# Altium footprint library ADP_Misc.PcbLib: 41 footprints (part 3 of 3)
Each footprint in its own frame and in the unit in brackets; x right, y up, seen from the top. Pads: shape width x height; smd on the part's side, far side on the other; paste and mask are expansions set on the pad; w line width, h text height; cw(c..) or ccw(c..) is an arc to the next point about the centre after c.
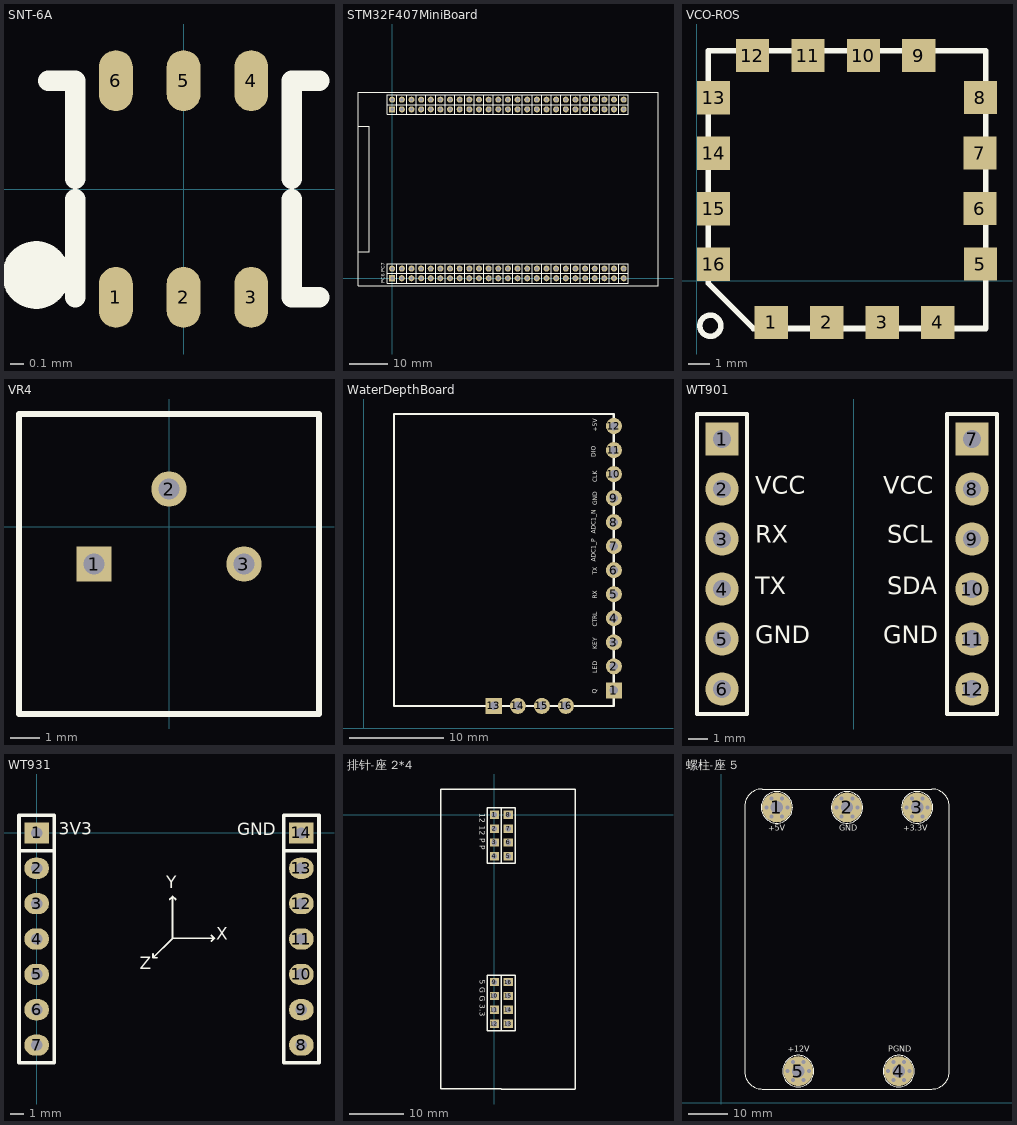
[diagram p2: the footprints below, top view; thin cyan lines are the x and y axes]

## SNT-6A [mm]
height 0.5
pads (6):
  oval 0.25x0.45 smd: 1(-0.5,-0.8) 2(0,-0.8) 3(0.5,-0.8) 4(0.5,0.8) 5(0,0.8) 6(-0.5,0.8)
Top Overlay:
  circle w0.25: c-1.09,-0.635 r0.125
  lines w0.152: -1,0.8 -0.8,0.8 -0.8,0.075 ; -0.8,-0.8 -0.8,-0.075 ; 0.8,-0.075 0.8,-0.8 1,-0.8 ; 0.8,0.075 0.8,0.8 1,0.8
3D body "SNT-6A.STEP": height 0.5, standoff 0, extent -0.799,-0.898 0.799,0.9

## STM32F407MiniBoard [mm]
pads (100):
  rect 1.6x1.6 hole 0.9: 1(0,0) 51(0,44.475)
  round 1.6 hole 0.9: 2(0,2.54) 3(2.54,0) 4(2.54,2.54) 5(5.08,0) 6(5.08,2.54) 7(7.62,0) 8(7.62,2.54) 9(10.16,0) 10(10.16,2.54) 11(12.7,0) 12(12.7,2.54) 13(15.24,0) 14(15.24,2.54) 15(17.78,0) 16(17.78,2.54) 17(20.32,0) 18(20.32,2.54) 19(22.86,0) 20(22.86,2.54) 21(25.4,0) 22(25.4,2.54) 23(27.94,0) 24(27.94,2.54) 25(30.48,0) 26(30.48,2.54) 27(33.02,0) 28(33.02,2.54) 29(35.56,0) 30(35.56,2.54) 31(38.1,0) 32(38.1,2.54) 33(40.64,0) 34(40.64,2.54) 35(43.18,0) 36(43.18,2.54) 37(45.72,0) 38(45.72,2.54) 39(48.26,0) 40(48.26,2.54) 41(50.8,0) 42(50.8,2.54) 43(53.34,0) 44(53.34,2.54) 45(55.88,0) 46(55.88,2.54) 47(58.42,0) 48(58.42,2.54) 49(60.96,0) 50(60.96,2.54) 52(2.54,44.475) 53(5.08,44.475) 54(7.62,44.475) 55(10.16,44.475) 56(12.7,44.475) 57(15.24,44.475) 58(17.78,44.475) 59(20.32,44.475) 60(22.86,44.475) 61(25.4,44.475) 62(27.94,44.475) 63(30.48,44.475) 64(33.02,44.475) 65(35.56,44.475) 66(38.1,44.475) 67(40.64,44.475) 68(43.18,44.475) 69(45.72,44.475) 70(48.26,44.475) 71(50.8,44.475) 72(53.34,44.475) 73(55.88,44.475) 74(58.42,44.475) 75(60.96,44.475) 76(60.96,47.015) 77(58.42,47.015) 78(55.88,47.015) 79(53.34,47.015) 80(50.8,47.015) 81(48.26,47.015) 82(45.72,47.015) 83(43.18,47.015) 84(40.64,47.015) 85(38.1,47.015) 86(35.56,47.015) 87(33.02,47.015) 88(30.48,47.015) 89(27.94,47.015) 90(25.4,47.015) 91(22.86,47.015) 92(20.32,47.015) 93(17.78,47.015) 94(15.24,47.015) 95(12.7,47.015) 96(10.16,47.015) 97(7.62,47.015) 98(5.08,47.015) 99(2.54,47.015) 100(0,47.015)
Top Overlay:
  lines w0.2: 62.23,-1.27 -1.27,-1.27 -1.27,3.81 62.23,3.81 ; 62.23,43.205 -1.27,43.205 -1.27,48.285 62.23,48.285
  lines w0.203: -1.27,1.27 62.23,1.27 ; -1.27,45.745 62.23,45.745 ; 1.27,-1.27 1.27,3.81 ; 1.27,43.205 1.27,48.285 ; 3.81,-1.27 3.81,3.81 ; 3.81,43.205 3.81,48.285 ; 6.35,-1.27 6.35,3.81 ; 6.35,43.205 6.35,48.285 ; 8.89,-1.27 8.89,3.81 ; 8.89,43.205 8.89,48.285 ; 11.43,-1.27 11.43,3.81 ; 11.43,43.205 11.43,48.285 ; 13.97,-1.27 13.97,3.81 ; 13.97,43.205 13.97,48.285 ; 16.51,-1.27 16.51,3.81 ; 16.51,43.205 16.51,48.285 ; 19.05,-1.27 19.05,3.81 ; 19.05,43.205 19.05,48.285 ; 21.59,-1.27 21.59,3.81 ; 21.59,43.205 21.59,48.285 ; 24.13,-1.27 24.13,3.81 ; 24.13,43.205 24.13,48.285 ; 26.67,-1.27 26.67,3.81 ; 26.67,43.205 26.67,48.285 ; 29.21,-1.27 29.21,3.81 ; 29.21,43.205 29.21,48.285 ; 31.75,-1.27 31.75,3.81 ; 31.75,43.205 31.75,48.285 ; 34.29,-1.27 34.29,3.81 ; 34.29,43.205 34.29,48.285 ; 36.83,-1.27 36.83,3.81 ; 36.83,43.205 36.83,48.285 ; 39.37,-1.27 39.37,3.81 ; 39.37,43.205 39.37,48.285 ; 41.91,-1.27 41.91,3.81 ; 41.91,43.205 41.91,48.285 ; 44.45,-1.27 44.45,3.81 ; 44.45,43.205 44.45,48.285 ; 46.99,-1.27 46.99,3.81 ; 46.99,43.205 46.99,48.285 ; 49.53,-1.27 49.53,3.81 ; 49.53,43.205 49.53,48.285 ; 52.07,-1.27 52.07,3.81 ; 52.07,43.205 52.07,48.285 ; 54.61,-1.27 54.61,3.81 ; 54.61,43.205 54.61,48.285 ; 57.15,-1.27 57.15,3.81 ; 57.15,43.205 57.15,48.285 ; 59.69,-1.27 59.69,3.81 ; 59.69,43.205 59.69,48.285 ; 62.23,-1.27 62.23,3.81 ; 62.23,43.205 62.23,48.285
  lines w0.254: -9,7 -8,7 -6,7 -6,40 -9,40 ; -9,-2 -1.27,-2 70,-2 70,49 62.23,49 -9,49 -9,48.285 -9,-2
  text "PC6 PC7" at -2,-1.27 h1
3D body "HDR2.54-1x2P.STEP": height 8.5, standoff -3, extent 57.15,43.205 59.69,48.285
3D body "HDR2.54-1x2P.STEP": height 8.5, standoff -3, extent 49.53,43.205 52.07,48.285
3D body "HDR2.54-1x2P.STEP": height 8.5, standoff -3, extent 54.61,43.205 57.15,48.285
3D body "HDR2.54-1x2P.STEP": height 8.5, standoff -3, extent 52.07,43.205 54.61,48.285
3D body "HDR2.54-1x2P.STEP": height 8.5, standoff -3, extent 59.69,43.205 62.23,48.285
3D body "HDR2.54-1x2P.STEP": height 8.5, standoff -3, extent 41.91,43.205 44.45,48.285
3D body "HDR2.54-1x2P.STEP": height 8.5, standoff -3, extent 44.45,43.205 46.99,48.285
3D body "HDR2.54-1x2P.STEP": height 8.5, standoff -3, extent 36.83,43.205 39.37,48.285
3D body "HDR2.54-1x2P.STEP": height 8.5, standoff -3, extent 39.37,43.205 41.91,48.285
3D body "HDR2.54-1x2P.STEP": height 8.5, standoff -3, extent 46.99,43.205 49.53,48.285
3D body "HDR2.54-1x2P.STEP": height 8.5, standoff -3, extent 29.21,43.205 31.75,48.285
3D body "HDR2.54-1x2P.STEP": height 8.5, standoff -3, extent 31.75,43.205 34.29,48.285
3D body "HDR2.54-1x2P.STEP": height 8.5, standoff -3, extent 24.13,43.205 26.67,48.285
3D body "HDR2.54-1x2P.STEP": height 8.5, standoff -3, extent 26.67,43.205 29.21,48.285
3D body "HDR2.54-1x2P.STEP": height 8.5, standoff -3, extent 34.29,43.205 36.83,48.285
3D body "HDR2.54-1x2P.STEP": height 8.5, standoff -3, extent 16.51,43.205 19.05,48.285
3D body "HDR2.54-1x2P.STEP": height 8.5, standoff -3, extent 19.05,43.205 21.59,48.285
3D body "HDR2.54-1x2P.STEP": height 8.5, standoff -3, extent 11.43,43.205 13.97,48.285
3D body "HDR2.54-1x2P.STEP": height 8.5, standoff -3, extent 13.97,43.205 16.51,48.285
3D body "HDR2.54-1x2P.STEP": height 8.5, standoff -3, extent 21.59,43.205 24.13,48.285
3D body "HDR2.54-1x2P.STEP": height 8.5, standoff -3, extent 3.81,43.205 6.35,48.285
3D body "HDR2.54-1x2P.STEP": height 8.5, standoff -3, extent 6.35,43.205 8.89,48.285
3D body "HDR2.54-1x2P.STEP": height 8.5, standoff -3, extent -1.27,43.205 1.27,48.285
3D body "HDR2.54-1x2P.STEP": height 8.5, standoff -3, extent 1.27,43.205 3.81,48.285
3D body "HDR2.54-1x2P.STEP": height 8.5, standoff -3, extent 8.89,43.205 11.43,48.285
3D body "HDR2.54-1x2P.STEP": height 8.5, standoff -3, extent 8.89,-1.27 11.43,3.81
3D body "HDR2.54-1x2P.STEP": height 8.5, standoff -3, extent 1.27,-1.27 3.81,3.81
3D body "HDR2.54-1x2P.STEP": height 8.5, standoff -3, extent -1.27,-1.27 1.27,3.81
3D body "HDR2.54-1x2P.STEP": height 8.5, standoff -3, extent 6.35,-1.27 8.89,3.81
3D body "HDR2.54-1x2P.STEP": height 8.5, standoff -3, extent 3.81,-1.27 6.35,3.81
3D body "HDR2.54-1x2P.STEP": height 8.5, standoff -3, extent 21.59,-1.27 24.13,3.81
3D body "HDR2.54-1x2P.STEP": height 8.5, standoff -3, extent 13.97,-1.27 16.51,3.81
3D body "HDR2.54-1x2P.STEP": height 8.5, standoff -3, extent 11.43,-1.27 13.97,3.81
3D body "HDR2.54-1x2P.STEP": height 8.5, standoff -3, extent 19.05,-1.27 21.59,3.81
3D body "HDR2.54-1x2P.STEP": height 8.5, standoff -3, extent 16.51,-1.27 19.05,3.81
3D body "HDR2.54-1x2P.STEP": height 8.5, standoff -3, extent 34.29,-1.27 36.83,3.81
3D body "HDR2.54-1x2P.STEP": height 8.5, standoff -3, extent 26.67,-1.27 29.21,3.81
3D body "HDR2.54-1x2P.STEP": height 8.5, standoff -3, extent 24.13,-1.27 26.67,3.81
3D body "HDR2.54-1x2P.STEP": height 8.5, standoff -3, extent 31.75,-1.27 34.29,3.81
3D body "HDR2.54-1x2P.STEP": height 8.5, standoff -3, extent 29.21,-1.27 31.75,3.81
3D body "HDR2.54-1x2P.STEP": height 8.5, standoff -3, extent 46.99,-1.27 49.53,3.81
3D body "HDR2.54-1x2P.STEP": height 8.5, standoff -3, extent 39.37,-1.27 41.91,3.81
3D body "HDR2.54-1x2P.STEP": height 8.5, standoff -3, extent 36.83,-1.27 39.37,3.81
3D body "HDR2.54-1x2P.STEP": height 8.5, standoff -3, extent 44.45,-1.27 46.99,3.81
3D body "HDR2.54-1x2P.STEP": height 8.5, standoff -3, extent 41.91,-1.27 44.45,3.81
3D body "HDR2.54-1x2P.STEP": height 8.5, standoff -3, extent 59.69,-1.27 62.23,3.81
3D body "HDR2.54-1x2P.STEP": height 8.5, standoff -3, extent 52.07,-1.27 54.61,3.81
3D body "HDR2.54-1x2P.STEP": height 8.5, standoff -3, extent 54.61,-1.27 57.15,3.81
3D body "HDR2.54-1x2P.STEP": height 8.5, standoff -3, extent 49.53,-1.27 52.07,3.81
3D body "HDR2.54-1x2P.STEP": height 8.5, standoff -3, extent 57.15,-1.27 59.69,3.81

## VCO-ROS [mm] "ROS-425-319"
height 5.33
pads (16):
  rect 1.52x1.52 smd: 1(3.404,-1.905) 2(5.944,-1.905) 3(8.484,-1.905) 4(11.024,-1.905) 5(12.979,0.768) 6(12.954,3.308) 7(12.954,5.848) 8(12.979,8.388) 9(10.16,10.312) 10(7.62,10.312) 11(5.08,10.312) 12(2.54,10.312) 13(0.762,8.382) 14(0.762,5.842) 15(0.762,3.302) 16(0.762,0.762)
Top Overlay:
  circle w0.254: c0.61,-2.057 r0.483
  lines w0.254: 0.508,-0.108 0.508,10.541 13.233,10.541 13.233,-2.184 2.584,-2.184 0.508,-0.108
3D body "ROS-425-319 in CK605 case detailed.step": height 4.57, standoff 0, extent 0.508,-2.184 13.208,10.516

## VR4 [mm] "Feed-Through Capacitor; 3 Leads"
pads (3):
  rect 1.2x1.2 hole 0.7: 1(-2.54,-1.27)
  round 1.2 hole 0.7: 2(0,1.27) 3(2.54,-1.27)
Top Overlay:
  lines w0.2: -5.08,-6.35 5.08,-6.35 5.08,3.81 2.54,3.81 -5.08,3.81 -5.08,-6.35
3D body "vr4.STEP": height 6, standoff 0, extent -5.022,-6.321 4.978,3.679

## WaterDepthBoard [mm]
pads (16):
  rect 1.7x1.7 hole 0.9: 1(26.468,3.99) 13(13.768,2.339)
  round 1.7 hole 0.9: 2(26.468,6.53) 3(26.468,9.07) 4(26.468,11.61) 5(26.468,14.15) 6(26.468,16.69) 7(26.468,19.23) 8(26.468,21.77) 9(26.468,24.31) 10(26.468,26.85) 11(26.468,29.39) 12(26.468,31.93) 14(16.308,2.339) 15(18.848,2.339) 16(21.388,2.339)
Top Overlay:
  lines w0.254: 3.227,2.339 26.468,2.339 26.468,13.642 26.468,33.2 3.227,33.2 3.227,13.642 3.227,2.339
  text "+5V" at 24.846,31.311 h0.76
  text "DIO" at 24.719,28.644 h0.76
  text "CLK" at 24.846,25.977 h0.76
  text "GND" at 24.846,23.564 h0.76
  text "ADC1_N" at 24.719,20.516 h0.76
  text "ADC1_P" at 24.719,17.595 h0.76
  text "TX" at 24.854,16.198 h0.76
  text "RX" at 24.854,13.658 h0.76
  text "CTRL" at 24.846,10.737 h0.76
  text "KEY" at 24.854,8.324 h0.76
  text "LED" at 24.854,5.784 h0.76
  text "Q" at 24.816,3.625 h0.76

## WT901 [mm] "维特智能九轴模块"
pads (12):
  rect 1.7x1.7 hole 0.9: 1(-6.7,-8.2) 7(6,-8.2)
  round 1.7 hole 0.9: 2(-6.7,-10.74) 3(-6.7,-13.28) 4(-6.7,-15.82) 5(-6.7,-18.36) 6(-6.7,-20.9) 8(6,-10.74) 9(6,-13.28) 10(6,-15.82) 11(6,-18.36) 12(6,-20.9)
Top Overlay:
  lines w0.2: -7.97,-22.17 -7.97,-6.93 -5.43,-6.93 -5.43,-22.17 -7.97,-22.17 ; 4.73,-22.17 4.73,-6.93 7.27,-6.93 7.27,-22.17 4.73,-22.17
  text "VCC" at -4.999,-11.284 h1.52
  text "VCC" at 1.499,-11.284 h1.52
  text "GND" at -5,-18.884 h1.52
  text "GND" at 1.499,-18.884 h1.52
  text "SDA" at 1.697,-16.384 h1.52
  text "SCL" at 1.699,-13.784 h1.52
  text "RX" at -5,-13.783 h1.52
  text "TX" at -5,-16.383 h1.52
3D body "HDR2.54-1P_M.STEP": height 8.5, standoff -3, extent -7.97,-19.63 -5.43,-17.09
3D body "HDR2.54-1P_M.STEP": height 8.5, standoff -3, extent -7.97,-17.09 -5.43,-14.55
3D body "HDR2.54-1P_M.STEP": height 8.5, standoff -3, extent -7.97,-22.17 -5.43,-19.63
3D body "HDR2.54-1P_M.STEP": height 8.5, standoff -3, extent -7.97,-12.01 -5.43,-9.47
3D body "HDR2.54-1P_M.STEP": height 8.5, standoff -3, extent -7.97,-9.47 -5.43,-6.93
3D body "HDR2.54-1P_M.STEP": height 8.5, standoff -3, extent -7.97,-14.55 -5.43,-12.01
3D body "HDR2.54-1P_M.STEP": height 8.5, standoff -3, extent 4.73,-19.63 7.27,-17.09
3D body "HDR2.54-1P_M.STEP": height 8.5, standoff -3, extent 4.73,-17.09 7.27,-14.55
3D body "HDR2.54-1P_M.STEP": height 8.5, standoff -3, extent 4.73,-22.17 7.27,-19.63
3D body "HDR2.54-1P_M.STEP": height 8.5, standoff -3, extent 4.73,-12.01 7.27,-9.47
3D body "HDR2.54-1P_M.STEP": height 8.5, standoff -3, extent 4.73,-9.47 7.27,-6.93
3D body "HDR2.54-1P_M.STEP": height 8.5, standoff -3, extent 4.73,-14.55 7.27,-12.01

## WT931 [mil]
pads (14):
  rect 70x60 hole 32: 1(0,0) 14(748.4,0)
  oval 70x60 hole 32: 2(0,-100) 3(0,-200) 4(0,-300) 5(0,-400) 6(0,-500) 7(0,-600) 8(748.4,-600) 9(748.4,-500) 10(748.4,-400) 11(748.4,-300) 12(748.4,-200) 13(748.4,-100)
Top Overlay:
  lines w5: 329.02,-341.41 329.02,-353.22 ; 340.83,-353.22 329.02,-353.22 ; 376.07,-188.06 384.42,-179.71 ; 384.7,-297.54 329.02,-353.22 ; 392.77,-188.06 384.42,-179.71 ; 494.18,-306.17 502.53,-297.82 ; 494.18,-289.47 502.53,-297.82 ; 384.42,-179.71 384.42,-297.82 502.53,-297.82
  lines w10: -50,-50 50,-50 ; 698.4,-50 798.4,-50 ; -50,-650 -50,50 50,50 50,-650 -50,-650 ; 698.4,-650 698.4,50 798.4,50 798.4,-650 698.4,-650
  text "GND" at 566.93,-19.05 h60
  text "3V3" at 62.99,-18.33 h60
  text "X" at 507.87,-314.96 h60
  text "Y" at 366.17,-169.29 h60
  text "Z" at 291.34,-397.64 h60
3D body "Female-Header-2.54-Single-7.stp": height 125.98, standoff -334.65, extent 699.2,-654.92 797.62,54.92
3D body "Female-Header-2.54-Single-7.stp": height 125.98, standoff -334.65, extent -49.21,-654.92 49.22,54.92

## 排针-座 2*4 [mil]
pads (16):
  rect 65x60 hole 40: 1(0,0) 2(0,-100) 3(0,-200) 4(0,-300) 5(100,-300) 6(100,-200) 7(100,-100) 8(100,0) 9(0,-1205) 10(0,-1305) 11(0,-1405) 12(0,-1505) 13(100,-1505) 14(100,-1405) 15(100,-1305) 16(100,-1205)
Top Overlay:
  lines w10: -384.96,-1974.92 -384.96,185.08 49.96,185.08 50,185.04 581.5,185.04 581.5,-1974.96 ; -384.92,-1974.96 50,-1974.96 50.04,-1975 581.54,-1975 ; 50,-1555 50,-1155 ; 50,-350 50,50 ; -50,-1555 -50,-1155 150,-1155 150,-1555 -50,-1555 ; -50,-350 150,-350 150,50 -50,50 -50,-350
  text "12 12 P P" at -105,10 h39.37
  text "5 G G 3.3" at -105,-1190 h39.37

## 螺柱-座 5 [mil]
pads (35):
  round 40 hole 40: 1(455.17,2966.81) 1(508.17,2875.01) 1(508.17,3058.61) 1(614.17,2875.01) 1(614.17,3058.61) 1(667.17,2966.81) 2(1160.17,2966.81) 2(1213.17,2875.01) 2(1213.17,3058.61) 2(1319.17,2875.01) 2(1319.17,3058.61) 2(1372.17,2966.81) 3(1865.17,2966.81) 3(1918.17,2875.01) 3(1918.17,3058.61) 3(2024.17,2875.01) 3(2024.17,3058.61) 3(2077.17,2966.81) 4(1680.17,316.81) 4(1733.17,225.01) 4(1733.17,408.61) 4(1839.17,225.01) 4(1839.17,408.61) 4(1892.17,316.81) 5(670.17,316.81) 5(723.17,225.01) 5(723.17,408.61) 5(829.17,225.01) 5(829.17,408.61) 5(882.17,316.81)
  round 300 hole 125: 1(561.17,2966.81) 2(1266.17,2966.81) 3(1971.17,2966.81) 4(1786.17,316.81) 5(776.17,316.81)
Bottom Layer:
  region: 516.91,2928.12 521.58,2932.93 532.63,2946.1 535.34,2950.08 537.55,2953.84 539.27,2957.4 540.5,2960.75 541.24,2963.89 541.48,2966.82 561.18,2947.13 558.25,2946.88 555.11,2946.14 551.76,2944.91 548.2,2943.19 544.44,2940.98 540.46,2938.27 536.28,2935.08 527.28,2927.22 522.48,2922.55
  lines w7.87: 488.85,2894.49 491.44,2897.09 ; 517.04,2922.68 561.17,2966.81 ; 561.17,2966.81 561.17,2966.81
  lines w39.37: 1865.17,2966.81 1865.17,2966.81
Top Overlay:
  circle w10: c561.17,2966.81 r157.48
  circle w10: c1971.17,2966.81 r157.48
  circle w10: c1786.17,316.81 r157.48
  circle w10: c1266.17,2966.81 r157.48
  circle w10: c776.17,316.81 r157.48
  lines w10: 236.17,316.81 ccw(c416.17,316.81) 416.17,136.81 2116.17,136.81 ccw(c2116.17,316.81) 2296.17,316.81 2296.17,2971.81 ccw(c2116.17,2971.81) 2116.17,3151.81 416.17,3151.81 ccw(c416.17,2971.81) 236.17,2971.81 236.17,316.81
  text "+5V" at 472.44,2731.81 h60
  text "GND" at 1186.17,2731.81 h60
  text "+3.3V" at 1830.71,2731.81 h60
  text "+12V" at 669.29,511.81 h60
  text "PGND" at 1680.17,511.81 h60
3D body "M3x14.STEP": height 553.16, standoff 1.96, extent 669.95,224.29 882.39,409.33
3D body "M3x14.STEP": height 553.16, standoff 1.96, extent 1679.94,224.29 1892.39,409.33
3D body "M3x14.STEP": height 553.16, standoff 1.96, extent 454.94,2874.29 667.39,3059.33
3D body "M3x14.STEP": height 553.16, standoff 1.96, extent 1864.94,2874.29 2077.39,3059.33
3D body "M3x14.STEP": height 553.16, standoff 1.96, extent 1159.94,2874.29 1372.39,3059.33